# Altium footprint library LUMI_Standard_Auto_Soldering_LIB.PcbLib: 344 footprints (part 12 of 22)
Each footprint in its own frame and in the unit in brackets; x right, y up, seen from the top. Pads: shape width x height; smd on the part's side, far side on the other; paste and mask are expansions set on the pad; w line width, h text height; cw(c..) or ccw(c..) is an arc to the next point about the centre after c.
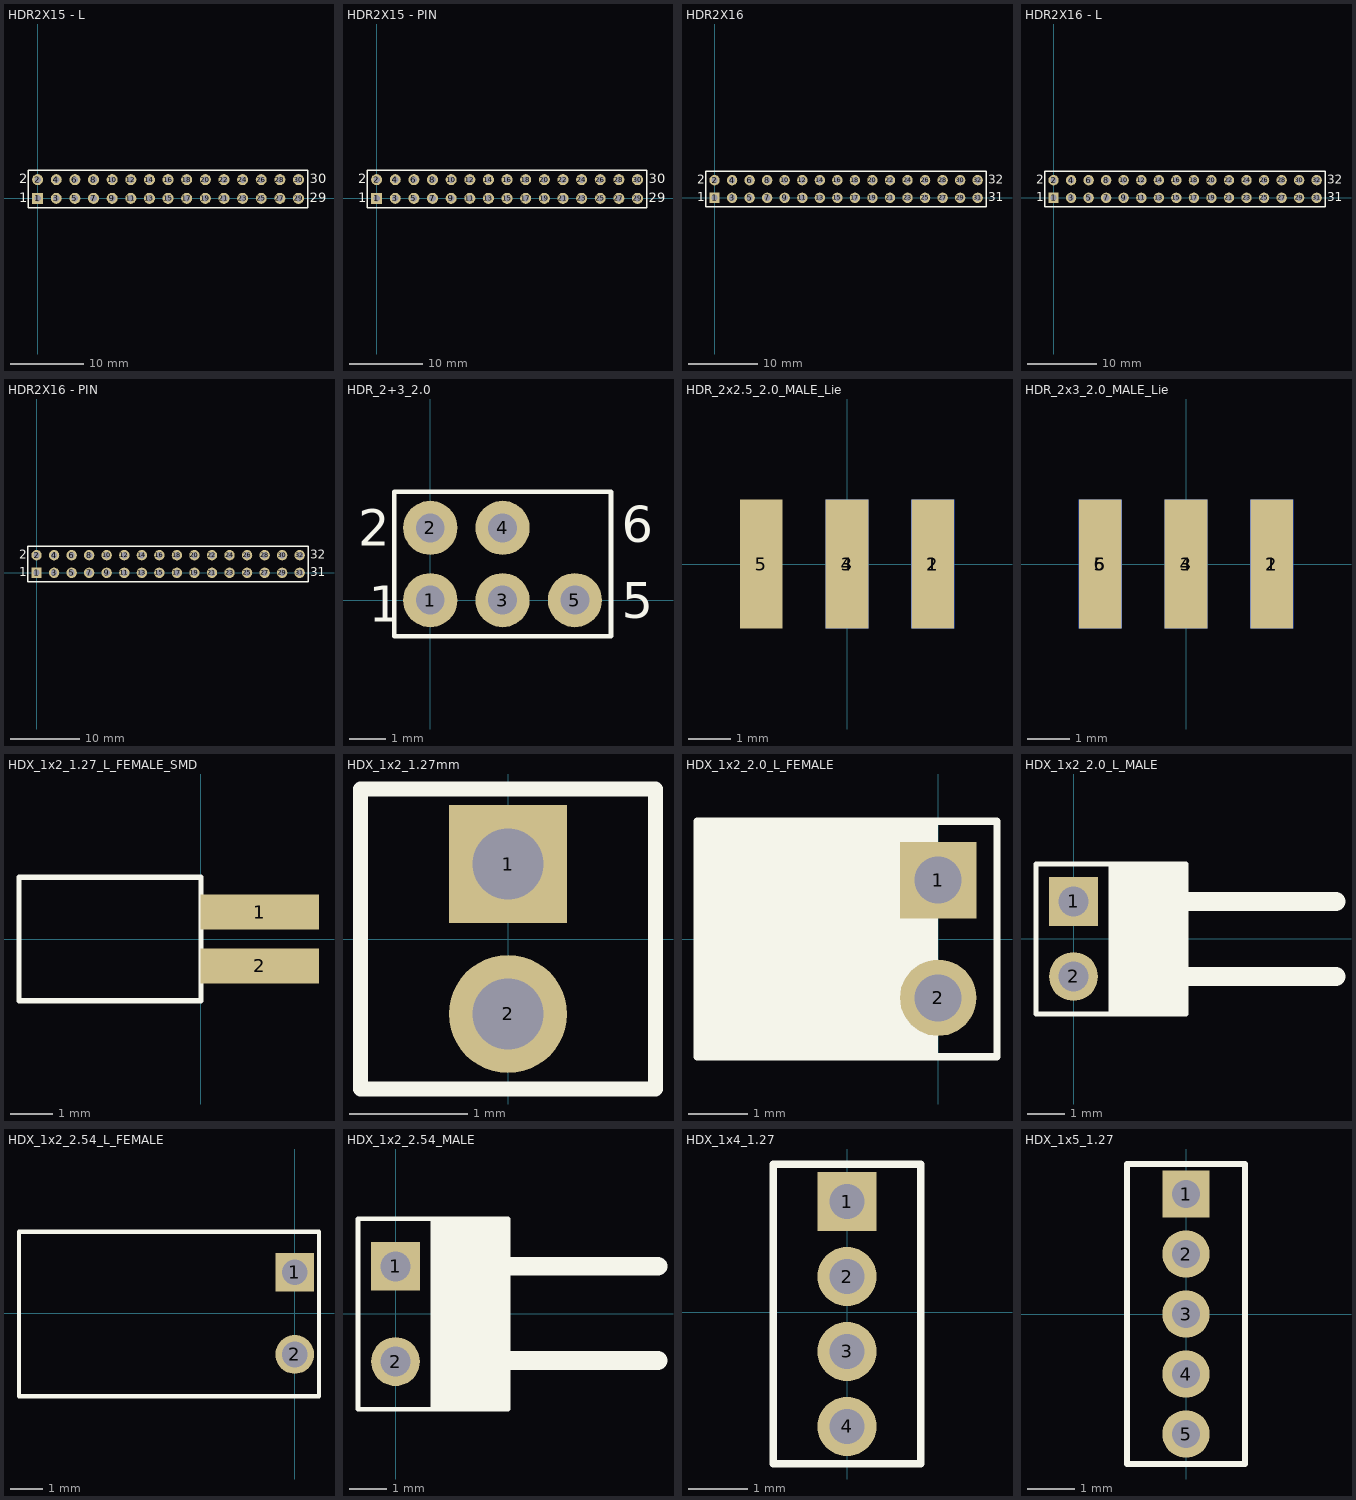
[diagram p11: the footprints below, top view; thin cyan lines are the x and y axes]

## HDR2X15 - L [mm] "Connector; Header; 15x2 Position"
pads (30):
  rect 1.5x1.5 hole 0.9: 1(0,0)
  round 1.5 hole 0.9: 2(0,2.54) 3(2.54,0) 4(2.54,2.54) 5(5.08,0) 6(5.08,2.54) 7(7.62,0) 8(7.62,2.54) 9(10.16,0) 10(10.16,2.54) 11(12.7,0) 12(12.7,2.54) 13(15.24,0) 14(15.24,2.54) 15(17.78,0) 16(17.78,2.54) 17(20.32,0) 18(20.32,2.54) 19(22.86,0) 20(22.86,2.54) 21(25.4,0) 22(25.4,2.54) 23(27.94,0) 24(27.94,2.54) 25(30.48,0) 26(30.48,2.54) 27(33.02,0) 28(33.02,2.54) 29(35.56,0) 30(35.56,2.54)
Top Overlay:
  lines w0.2: -1.27,-1.27 36.83,-1.27 36.83,3.81 -1.27,3.81 -1.27,-1.27
  text "1" at -2.54,-0.508 h1.27
  text "2" at -2.54,2.032 h1.27
  text "29" at 37.084,-0.508 h1.27
  text "30" at 37.084,2.032 h1.27
3D body: height 3.2, standoff -5.08, extent -1.219,-9.384 1.321,3.034
3D body: height 3.2, standoff -5.08, extent 1.321,-9.384 3.861,3.034
3D body: height 3.2, standoff -5.08, extent 3.861,-9.384 6.401,3.034
3D body: height 3.2, standoff -5.08, extent 6.401,-9.384 8.941,3.034
3D body: height 3.2, standoff -5.08, extent 8.89,-9.384 11.43,3.034
3D body: height 3.2, standoff -5.08, extent 11.43,-9.384 13.97,3.034
3D body: height 3.2, standoff -5.08, extent 13.97,-9.384 16.51,3.034
3D body: height 3.2, standoff -5.08, extent 16.485,-9.384 19.025,3.034
3D body: height 3.2, standoff -5.08, extent 19.025,-9.384 21.565,3.034
3D body: height 3.2, standoff -5.08, extent 21.565,-9.384 24.105,3.034
3D body: height 3.2, standoff -5.08, extent 24.105,-9.384 26.645,3.034
3D body: height 3.2, standoff -5.08, extent 26.645,-9.384 29.185,3.034
3D body: height 3.2, standoff -5.08, extent 29.134,-9.384 31.674,3.034
3D body: height 3.2, standoff -5.08, extent 31.648,-9.41 34.188,3.009
3D body: height 3.2, standoff -5.08, extent 34.188,-9.384 36.728,3.034

## HDR2X15 - PIN [mm] "Connector; Header; 15x2 Position"
pads (30):
  rect 1.5x1.5 hole 0.9: 1(0,0)
  round 1.5 hole 0.9: 2(0,2.54) 3(2.54,0) 4(2.54,2.54) 5(5.08,0) 6(5.08,2.54) 7(7.62,0) 8(7.62,2.54) 9(10.16,0) 10(10.16,2.54) 11(12.7,0) 12(12.7,2.54) 13(15.24,0) 14(15.24,2.54) 15(17.78,0) 16(17.78,2.54) 17(20.32,0) 18(20.32,2.54) 19(22.86,0) 20(22.86,2.54) 21(25.4,0) 22(25.4,2.54) 23(27.94,0) 24(27.94,2.54) 25(30.48,0) 26(30.48,2.54) 27(33.02,0) 28(33.02,2.54) 29(35.56,0) 30(35.56,2.54)
Top Overlay:
  lines w0.2: -1.27,-1.27 -1.27,3.81 36.83,3.81 36.83,-1.27 -1.27,-1.27
  text "30" at 37.084,2.032 h1.27
  text "29" at 37.084,-0.508 h1.27
  text "2" at -2.54,2.032 h1.27
  text "1" at -2.54,-0.508 h1.27
3D body: height 6.02, standoff -3.1, extent -1.143,-1.27 1.397,3.81
3D body: height 6.02, standoff -3.1, extent 1.372,-1.27 3.912,3.81
3D body: height 6.02, standoff -3.1, extent 3.886,-1.27 6.426,3.81
3D body: height 6.02, standoff -3.1, extent 6.426,-1.27 8.966,3.81
3D body: height 6.02, standoff -3.1, extent 8.966,-1.27 11.506,3.81
3D body: height 6.02, standoff -3.1, extent 11.506,-1.27 14.046,3.81
3D body: height 6.02, standoff -3.1, extent 14.021,-1.27 16.561,3.81
3D body: height 6.02, standoff -3.1, extent 16.561,-1.27 19.101,3.81
3D body: height 6.02, standoff -3.1, extent 19.05,-1.27 21.59,3.81
3D body: height 6.02, standoff -3.1, extent 21.59,-1.27 24.13,3.81
3D body: height 6.02, standoff -3.1, extent 24.13,-1.27 26.67,3.81
3D body: height 6.02, standoff -3.1, extent 26.645,-1.27 29.185,3.81
3D body: height 6.02, standoff -3.1, extent 29.159,-1.27 31.699,3.81
3D body: height 6.02, standoff -3.1, extent 31.699,-1.27 34.239,3.81
3D body: height 6.02, standoff -3.1, extent 34.239,-1.27 36.779,3.81

## HDR2X16 [mm] "Connector; Header; 16x2 Position"
pads (32):
  rect 1.5x1.5 hole 0.9: 1(0,0)
  round 1.5 hole 0.9: 2(0,2.54) 3(2.54,0) 4(2.54,2.54) 5(5.08,0) 6(5.08,2.54) 7(7.62,0) 8(7.62,2.54) 9(10.16,0) 10(10.16,2.54) 11(12.7,0) 12(12.7,2.54) 13(15.24,0) 14(15.24,2.54) 15(17.78,0) 16(17.78,2.54) 17(20.32,0) 18(20.32,2.54) 19(22.86,0) 20(22.86,2.54) 21(25.4,0) 22(25.4,2.54) 23(27.94,0) 24(27.94,2.54) 25(30.48,0) 26(30.48,2.54) 27(33.02,0) 28(33.02,2.54) 29(35.56,0) 30(35.56,2.54) 31(38.1,0) 32(38.1,2.54)
Top Overlay:
  lines w0.2: -1.27,-1.27 39.37,-1.27 39.37,3.81 -1.27,3.81 -1.27,-1.27
  text "2" at -2.54,2.032 h1.27
  text "1" at -2.54,-0.508 h1.27
  text "31" at 39.624,-0.508 h1.27
  text "32" at 39.624,2.032 h1.27
3D body: height 8.4, standoff -3, extent 19.075,-1.23 39.395,3.77
3D body: height 8.4, standoff -3, extent -1.244,-1.23 19.076,3.77

## HDR2X16 - L [mm] "Connector; Header; 16x2 Position"
pads (32):
  rect 1.5x1.5 hole 0.9: 1(0,0)
  round 1.5 hole 0.9: 2(0,2.54) 3(2.54,0) 4(2.54,2.54) 5(5.08,0) 6(5.08,2.54) 7(7.62,0) 8(7.62,2.54) 9(10.16,0) 10(10.16,2.54) 11(12.7,0) 12(12.7,2.54) 13(15.24,0) 14(15.24,2.54) 15(17.78,0) 16(17.78,2.54) 17(20.32,0) 18(20.32,2.54) 19(22.86,0) 20(22.86,2.54) 21(25.4,0) 22(25.4,2.54) 23(27.94,0) 24(27.94,2.54) 25(30.48,0) 26(30.48,2.54) 27(33.02,0) 28(33.02,2.54) 29(35.56,0) 30(35.56,2.54) 31(38.1,0) 32(38.1,2.54)
Top Overlay:
  lines w0.2: -1.27,-1.27 -1.27,3.81 39.37,3.81 39.37,-1.27 -1.27,-1.27
  text "32" at 39.624,2.032 h1.27
  text "31" at 39.624,-0.508 h1.27
  text "1" at -2.54,-0.508 h1.27
  text "2" at -2.54,2.032 h1.27
3D body: height 3.2, standoff -5.08, extent 36.678,-9.486 39.218,2.933
3D body: height 3.2, standoff -5.08, extent 34.163,-9.486 36.703,2.933
3D body: height 3.2, standoff -5.08, extent 31.674,-9.486 34.214,2.933
3D body: height 3.2, standoff -5.08, extent 29.185,-9.486 31.725,2.933
3D body: height 3.2, standoff -5.08, extent 26.695,-9.486 29.235,2.933
3D body: height 3.2, standoff -5.08, extent 24.155,-9.486 26.695,2.933
3D body: height 3.2, standoff -5.08, extent 21.615,-9.486 24.155,2.933
3D body: height 3.2, standoff -5.08, extent 19.101,-9.486 21.641,2.933
3D body: height 3.2, standoff -5.08, extent 16.561,-9.486 19.101,2.933
3D body: height 3.2, standoff -5.08, extent 14.021,-9.486 16.561,2.933
3D body: height 3.2, standoff -5.08, extent 11.506,-9.486 14.046,2.933
3D body: height 3.2, standoff -5.08, extent 8.992,-9.486 11.532,2.933
3D body: height 3.2, standoff -5.08, extent 6.452,-9.486 8.992,2.933
3D body: height 3.2, standoff -5.08, extent 3.912,-9.486 6.452,2.933
3D body: height 3.2, standoff -5.08, extent 1.372,-9.486 3.912,2.933
3D body: height 3.2, standoff -5.08, extent -1.118,-9.486 1.422,2.933

## HDR2X16 - PIN [mm] "Connector; Header; 16x2 Position"
pads (32):
  rect 1.5x1.5 hole 0.9: 1(0,0)
  round 1.5 hole 0.9: 2(0,2.54) 3(2.54,0) 4(2.54,2.54) 5(5.08,0) 6(5.08,2.54) 7(7.62,0) 8(7.62,2.54) 9(10.16,0) 10(10.16,2.54) 11(12.7,0) 12(12.7,2.54) 13(15.24,0) 14(15.24,2.54) 15(17.78,0) 16(17.78,2.54) 17(20.32,0) 18(20.32,2.54) 19(22.86,0) 20(22.86,2.54) 21(25.4,0) 22(25.4,2.54) 23(27.94,0) 24(27.94,2.54) 25(30.48,0) 26(30.48,2.54) 27(33.02,0) 28(33.02,2.54) 29(35.56,0) 30(35.56,2.54) 31(38.1,0) 32(38.1,2.54)
Top Overlay:
  lines w0.2: -1.27,-1.27 39.37,-1.27 39.37,3.81 -1.27,3.81 -1.27,-1.27
  text "2" at -2.54,2.032 h1.27
  text "1" at -2.54,-0.508 h1.27
  text "31" at 39.624,-0.508 h1.27
  text "32" at 39.624,2.032 h1.27
3D body: height 6.02, standoff -3.1, extent -1.118,-1.245 1.422,3.835
3D body: height 6.02, standoff -3.1, extent 1.422,-1.245 3.962,3.835
3D body: height 6.02, standoff -3.1, extent 3.962,-1.245 6.502,3.835
3D body: height 6.02, standoff -3.1, extent 6.502,-1.245 9.042,3.835
3D body: height 6.02, standoff -3.1, extent 9.042,-1.245 11.582,3.835
3D body: height 6.02, standoff -3.1, extent 11.582,-1.245 14.122,3.835
3D body: height 6.02, standoff -3.1, extent 14.122,-1.245 16.662,3.835
3D body: height 6.02, standoff -3.1, extent 16.662,-1.245 19.202,3.835
3D body: height 6.02, standoff -3.1, extent 19.202,-1.245 21.742,3.835
3D body: height 6.02, standoff -3.1, extent 21.692,-1.245 24.232,3.835
3D body: height 6.02, standoff -3.1, extent 24.206,-1.245 26.746,3.835
3D body: height 6.02, standoff -3.1, extent 26.721,-1.245 29.261,3.835
3D body: height 6.02, standoff -3.1, extent 29.185,-1.245 31.725,3.835
3D body: height 6.02, standoff -3.1, extent 31.725,-1.245 34.265,3.835
3D body: height 6.02, standoff -3.1, extent 34.265,-1.245 36.805,3.835
3D body: height 6.02, standoff -3.1, extent 36.805,-1.245 39.345,3.835

## HDR_2+3_2.0 [mm]
pads (5):
  round 1.5 hole 0.8: 1(0,0) 2(0,2) 3(2,0) 4(2,2) 5(4,0)
Top Overlay:
  lines w0.127: -1,-1 -1,3 5,3 5,-1 -1,-1
  text "5" at 5.3,-0.5 h1
  text "6" at 5.3,1.6 h1
  text "2" at -2,1.5 h1
  text "1" at -1.7,-0.6 h1
3D body: height 2, standoff 0, extent -1,-1 5,3
3D body: height 5, standoff -3, extent 3.504,-0.499 4.5,0.499
3D body: height 5, standoff -3, extent 1.504,1.501 2.5,2.499
3D body: height 5, standoff -3, extent 1.504,-0.499 2.5,0.499
3D body: height 5, standoff -3, extent -0.496,-0.499 0.5,0.499
3D body: height 5, standoff -3, extent -0.496,1.501 0.5,2.499

## HDR_2x2.5_2.0_MALE_Lie [mm]
pads (5):
  rect 1x3 smd mask+0: 1(2,0) 3(0,0) 5(-2,0)
  rect 1x3 smd far side mask+0: 2(2,0) 4(0,0)
3D body: height 0.5, standoff 0, extent 1.752,-1.249 2.25,6.751
3D body: height 0.5, standoff 0, extent -0.248,-1.249 0.25,6.751
3D body: height 0.5, standoff 0, extent 1.752,-1.249 2.25,6.751
3D body: height 0.5, standoff 0, extent -0.248,-1.249 0.25,6.751
3D body: height 0.5, standoff 0, extent -2.248,-1.249 -1.75,6.751

## HDR_2x3_2.0_MALE_Lie [mm]
pads (6):
  rect 1x3 smd mask+0: 1(2,0) 3(0,0) 5(-2,0)
  rect 1x3 smd far side mask+0: 2(2,0) 4(0,0) 6(-2,0)
3D body: height 0.5, standoff 0, extent -2.248,-1.249 -1.75,6.751
3D body: height 0.5, standoff 0, extent -0.248,-1.249 0.25,6.751
3D body: height 0.5, standoff 0, extent 1.752,-1.249 2.25,6.751
3D body: height 0.5, standoff 0, extent -2.248,-1.249 -1.75,6.751
3D body: height 0.5, standoff 0, extent -0.248,-1.249 0.25,6.751
3D body: height 0.5, standoff 0, extent 1.752,-1.249 2.25,6.751

## HDX_1x2_1.27_L_FEMALE_SMD [mm]
pads (2):
  rect 2.8x0.83 smd mask+0.07: 1(1.389,0.635) 2(1.389,-0.635)
Top Overlay:
  lines w0.127: -4.3,-1.46 -4.3,1.46 0,1.46 0,-1.46 -4.3,-1.46
3D body: height 0.4, standoff 0, extent -0.381,-0.889 2.667,-0.381
3D body: height 0.4, standoff 0, extent -0.381,0.381 2.667,0.889
3D body: height 1.8, standoff 0, extent -4.318,-1.46 0,1.46

## HDX_1x2_1.27mm [mm]
pads (2):
  rect 1x1 hole 0.6 mask+0.07: 1(0,0.635)
  round 1 hole 0.6 mask+0.07: 2(0,-0.635)
Top Overlay:
  lines w0.127: -1.25,-1.27 -1.25,1.27 1.25,1.27 1.25,-1.27 -1.25,-1.27

## HDX_1x2_2.0_L_FEMALE [mm]
pads (2):
  rect 1.3x1.3 hole 0.8 mask+0.07: 1(0,1)
  round 1.3 hole 0.8 mask+0.07: 2(0,-1)
Top Overlay:
  region: 0,2 -4.1,2 -4.1,-2 0,-2
  lines w0.127: -3,-2 -3,2 ; -1,-2 -1,2 ; -4.1,-2 -4.1,2 1,2 1,-2 -4.1,-2
3D body: height 2.8, standoff 0, extent -4.1,-2 0,2
3D body: height 1.65, standoff 1.15, extent -4.249,-1.25 -0.249,-0.752
3D body: height 1, standoff -2, extent -0.25,-1.25 0.25,-0.752
3D body: height 1, standoff -2, extent -0.25,0.75 0.25,1.248
3D body: height 1.65, standoff 1.15, extent -4.249,0.75 -0.249,1.248

## HDX_1x2_2.0_L_MALE [mm]
pads (2):
  rect 1.3x1.3 hole 0.8 mask+0.07: 1(0,1)
  round 1.3 hole 0.8 mask+0.07: 2(0,-1)
Top Overlay:
  rectangle: 1,-2 3,2
  lines w0.127: 0,-2 3,-2 3,2 0,2 ; -1,-2 1,-2 1,2 -1,2 -1,-2
  lines w0.5: 3,-1 7,-1 ; 3,1 7,1
3D body: height 1.25, standoff 0.75, extent 0.249,-1.248 7.249,-0.75
3D body: height 1, standoff -2, extent -0.25,-1.248 0.25,-0.75
3D body: height 1, standoff -2, extent -0.25,0.752 0.25,1.25
3D body: height 1.25, standoff 0.75, extent 0.249,0.752 7.249,1.25
3D body: height 2, standoff 0, extent 1,-2 3,2

## HDX_1x2_2.54_L_FEMALE [mm]
pads (2):
  rect 1.2x1.2 hole 0.8: 1(0,1.27)
  round 1.2 hole 0.8: 2(0,-1.27)
Top Overlay:
  lines w0.127: -8.52,-2.56 -8.52,2.52 0.75,2.52 0.75,-2.56 -8.52,-2.56
3D body: height 3, standoff 0.5, extent -8.5,-2.52 -0.25,2.48
3D body: height 1, standoff -3, extent -0.3,0.972 0.299,1.57
3D body: height 1, standoff -3, extent -0.3,-1.567 0.299,-0.97

## HDX_1x2_2.54_MALE [mm]
pads (2):
  rect 1.3x1.3 hole 0.8 mask+0.07: 1(0,1.27)
  round 1.3 hole 0.8 mask+0.07: 2(0,-1.27)
Top Overlay:
  rectangle: 1,-2.54 3,2.54
  lines w0.127: 0,2.54 3,2.54 3,-2.54 0.81,-2.54 ; -1,-2.54 1,-2.54 1,2.54 -1,2.54 -1,-2.54
  lines w0.5: 3,-1.238 7,-1.238 ; 3,1.27 7,1.27
3D body: height 1, standoff -2, extent -0.25,-1.518 0.25,-1.02
3D body: height 1.25, standoff 0.75, extent 0.25,-1.518 7.25,-1.02
3D body: height 1, standoff -2, extent -0.25,1.022 0.25,1.52
3D body: height 1.25, standoff 0.75, extent 0.249,1.022 7.249,1.52
3D body: height 2, standoff 0, extent 1,-2.54 3,2.54

## HDX_1x4_1.27 [mm]
pads (4):
  rect 1x1 hole 0.6 mask+0.07: 1(0,1.875)
  round 1 hole 0.6 mask+0.07: 2(0,0.605) 3(0,-0.665) 4(0,-1.935)
Top Overlay:
  lines w0.127: -1.25,-2.57 -1.25,-0.03 -1.25,2.51 1.25,2.51 1.25,-0.03 1.25,-2.57 -1.25,-2.57

## HDX_1x5_1.27 [mm]
pads (5):
  rect 1x1 hole 0.6 mask+0.07: 1(0,2.54)
  round 1 hole 0.6 mask+0.07: 2(0,1.27) 3(0,0) 4(0,-1.27) 5(0,-2.54)
Top Overlay:
  lines w0.127: -1.25,-3.175 -1.25,-1.905 -1.25,0.635 -1.25,3.175 1.25,3.175 1.25,0.635 1.25,-1.905 1.25,-3.175 -1.25,-3.175